# Altium schematic symbol library Schlib.SchLib: 725 symbols (part 2 of 6) (continued)
## DRV8800PWPR
designator U?  (value not drawn)
Bipolar Motor Driver DMOS Parallel 16-HTSSOP; Manufacturer: Texas Instruments; Manufacturer Part Number: DRV8800PWPR; Supplier: Mouser; Supplier Part Number: 595-DRV8800PWPR; RoHS: Yes; Category: Integrated Circuits (ICs); Stock: 2535; Pricing: 1=2.23, 10=1.92, 50=1.92, 100=1.61, 1000=1.1, 10000=0.979 (USD); ComponentLink1URL: https://datasheet.ciiva.com/15109/getdatasheetpartid-482679-15109562.pdf?src-supplier=Verical; ComponentLink1Description: https://datasheet.ciiva.com/15109/getdatasheetpartid-482679-15109562.pdf?src-supplier=Verical; ComponentLink2URL: https://datasheet.ciiva.com/1958/drv8800-1958738.pdf?src-supplier=Digikey; ComponentLink2Description: https://datasheet.ciiva.com/1958/drv8800-1958738.pdf?src-supplier=Digikey; ComponentLink3URL: https://datasheet.ciiva.com/1958/drv8800-1958739.pdf?src-supplier=Digikey; ComponentLink3Description: https://datasheet.ciiva.com/1958/drv8800-1958739.pdf?src-supplier=Digikey; ComponentLink4URL: https://datasheet.ciiva.com/1958/drv8800-1958740.pdf?src-supplier=Digikey; ComponentLink4Description: https://datasheet.ciiva.com/1958/drv8800-1958740.pdf?src-supplier=Digikey; ComponentLink5URL: https://datasheet.ciiva.com/3229/drv8801-3229003.pdf?src-supplier=Avnet; ComponentLink5Description: https://datasheet.ciiva.com/3229/drv8801-3229003.pdf?src-supplier=Avnet
footprint DRV8800PWPR
pins: 1 NFAULT, 2 MODE, 3 PHASE, 4 GND, 5 NSLEEP, 6 ENABLE, 7 OUT+, 8 SENSE, 9 VBB, 10 OUT-, 11 CP1, 12 CP2, 13 GND, 14 VCP, 15 VREG, 16 NC, 17 EPAD

## DS04-254-1L-04BK
designator SW?
Switch DIP OFF ON SPST 4 Raised Slide 0.025A 24VDC PC Pins 2.54mm Thru-Hole Tube; Manufacturer: CUI; Manufacturer Part Number: DS04-254-1L-04BK; Supplier: Digikey; Supplier Part Number: 2223-DS04-254-1L-04BK-ND; RoHS: Yes
footprint DS04-254-1L-04BK
pins: 1A COM1, 1B NO1, 2A COM2, 2B NO2, 3A COM3, 3B NO3, 4A COM4, 4B NO4

## DS04-254-2-01BK-SMT
designator SW?  (value not drawn)
Switch DIP OFF ON SPST 1 Flat Slide 0.025A 24VDC Gull Wing 2.54mm SMD Tube; Manufacturer: CUI Devices; Manufacturer Part Number: DS04-254-2-01BK-SMT; Switching Current: 25mA; Switching Voltage: 24V; Supplier: Digikey; Supplier Part Number: 2223-DS04-254-2-01BK-SMT-ND; RoHS: Yes; Category: DIP Switches; Stock: 6504; Pricing: 1=0.79, 10=0.642, 25=0.5908, 120=0.51167, 360=0.46197, 600=0.4403, 1080=0.41642, 2520=0.38388, 5040=0.35882 (USD); Length: 3.54mm; Width: 6.2mm; Height: 3.66mm; Pitch: 2.54mm; ComponentLink1URL: https://www.cuidevices.com/product/resource/digikeypdf/ds04-254-smt.pdf?src-supplier=Digikey; ComponentLink1Description: https://www.cuidevices.com/product/resource/digikeypdf/ds04-254-smt.pdf?src-supplier=Digikey; ComponentLink2URL: https://datasheet.octopart.com/DS04-254-2-01BK-SMT-CUI-Devices-datasheet-155993650.pdf?src-supplier=Future+Electronics; ComponentLink2Description: https://datasheet.octopart.com/DS04-254-2-01BK-SMT-CUI-Devices-datasheet-155993650.pdf?src-supplier=Future+Electronics
footprint DS04-254-2-01BK-SMT
pins: 1 COM1, 1B NO1

## ECS-80-12-33-JGN-TR
designator Y?  Operating Frequency: 8 mHz  (hidden comment: *)
Crystal 8MHz ±20ppm (Tol) ±30ppm (Stability) 12pF FUND 400Ohm 4-Pin Mini-CSMD T/R; Manufacturer: ECS International; Manufacturer Part Number: ECS-80-12-33-JGN-TR; Supplier: Arrow Electronics; Supplier Part Number: ECS-80-12-33-JGN-TR; RoHS: No; Stock: 22000; Pricing: 1000=0.3051, 3000=0.3048, 5000=0.2963 (USD); RoHS Compliant: Yes; ComponentLink1URL: https://datasheet.octopart.com/ECS-80-12-33-JGN-TR-ECS-International-datasheet-140089731.pdf?src-supplier=Future+Electronics; ComponentLink1Description: https://datasheet.octopart.com/ECS-80-12-33-JGN-TR-ECS-International-datasheet-140089731.pdf?src-supplier=Future+Electronics; ComponentLink2URL: https://datasheet.octopart.com/ECS-80-12-33-JGN-TR-ECS-International-datasheet-17018741.pdf?src-supplier=Master+Electronics; ComponentLink2Description: https://datasheet.octopart.com/ECS-80-12-33-JGN-TR-ECS-International-datasheet-17018741.pdf?src-supplier=Master+Electronics
footprint ECS-80-12-33-JGN-TR
pins: 1, 2, 3, 4

## ECS-160-20-46X
designator Y?
16 MHz Â±30ppm Crystal 20pF 50 Ohms HC-46/X; Manufacturer Part Number: ECS-160-20-46X
footprint XTAL_ECS-160-20-46X
pins: 1, 2

## ECS-250-18-33-JTN-TR
designator Y?  Operating Frequency: 25MHz  (hidden comment: *)
Crystal 25MHz ±20ppm (Tol) ±20ppm (Stability) 18pF FUND 40Ohm 4-Pin Mini-CSMD T/R; Manufacturer: ECS International; Manufacturer Part Number: ECS-250-18-33-JTN-TR; Supplier: Mouser; Supplier Part Number: 520-250-18-33-JTNT; RoHS: Yes; Stock: 1820; Pricing: 1=0.44, 10=0.354, 50=0.354, 100=0.342, 1000=0.305, 10000=0.239 (USD); ComponentLink1URL: http://www.ecsxtal.com/store/pdf/ecx-32.pdf?src-supplier=Digikey; ComponentLink1Description: http://www.ecsxtal.com/store/pdf/ecx-32.pdf?src-supplier=Digikey
footprint ECS-250-18-33-JTN-TR
pins: 1, 2, 3, 4

## ECS-320-8-37CKM
designator Y?
32 MHz Â±10ppm Crystal 8pF 60 Ohms 4-SMD, No Lead; Manufacturer Part Number: ECS-320-8-37CKM
footprint XTAL_ECS-320-8-37CKM
pins: 1 IN/OUT (io), 2 GND (power), 3 OUT/IN (io), 4 GND (power)

## ECS-327MVATX-2-CN-TR
designator Y?  (value not drawn)
Oscillator XO 0.032768MHz ±25ppm 15pF CMOS 55% 1.8V/2.5V/3.3V 4-Pin Mini-SMD T/R; Manufacturer: ECS International; Manufacturer Part Number: ECS-327MVATX-2-CN-TR; Supplier: Digi-Key; Supplier Part Number: XC3154CT-ND; RoHS: Yes; Category: Oscillators; Stock: 12696; Pricing: 1=1.24000, 10=1.09700, 50=1.02560, 100=0.90630, 500=0.85860 (USD)
footprint ECS-327MVATX-2-CN-TR
pins: 1 T_S, 2 GND, 3 OUT, 4 VDD
text: 32.768 kHz

## ECS-327MVATX-3-CN-TR
designator *
Oscillator XO 0.032768MHz ±25ppm 15pF CMOS 55% 1.8V/2.5V/3.3V 4-Pin Mini-SMD T/R; Manufacturer: ECS International; Manufacturer Part Number: ECS-327MVATX-3-CN-TR; Supplier: Future Electronics; Supplier Part Number: 1138685; RoHS: No; Category: Oscillators; Stock: 1000; Pricing: 1000=0.59, 2000=0.575, 3000=0.565, 4000=0.555 (USD); ComponentLink1URL: https://datasheet.octopart.com/ECS-327MVATX-3-CN-TR-ECS-International-datasheet-142139770.pdf?src-supplier=Future+Electronics; ComponentLink1Description: https://datasheet.octopart.com/ECS-327MVATX-3-CN-TR-ECS-International-datasheet-142139770.pdf?src-supplier=Future+Electronics; ComponentLink2URL: https://ecsxtal.com/store/pdf/ECS-327MVATX.pdf?src-supplier=Digi-Key; ComponentLink2Description: https://ecsxtal.com/store/pdf/ECS-327MVATX.pdf?src-supplier=Digi-Key; ComponentLink3URL: https://datasheet.octopart.com/ECS-327MVATX-3-CN-TR-ECS-International-datasheet-164298192.pdf?src-supplier=Master+Electronics; ComponentLink3Description: https://datasheet.octopart.com/ECS-327MVATX-3-CN-TR-ECS-International-datasheet-164298192.pdf?src-supplier=Master+Electronics
footprint ECS-327MVATX-3-CN-TR
pins: 1 T_S, 2 GND, 3 OUT, 4 VDD
text: 32.768 kHz

## ECS-2520MV-240-DN-TR
designator X?  (value not drawn)
Xtal Osc Xo 24.0000MHZ Cmos SMD; Manufacturer: ECS International; Manufacturer Part Number: ECS-2520MV-240-DN-TR; Supplier: Digi-Key; Supplier Part Number: 50-ECS-2520MV-240-DN-TRCT-ND; RoHS: No; Stock: 4023; Pricing: 1=1.23000, 10=1.17400, 50=1.14640, 100=0.98260, 500=0.95532, 1000=0.80520 (USD)
footprint ECS-2520MV-240-DN-TR
pins: 1 Tri-state, 2 GND, 3 OUT, 4 VDD

## EEE-1AA471UAP
designator C?  value 470uF  (hidden comment: *)
Cap Aluminum 470uF 10V 20% (8 X 10.2mm) SMD 390mA 1000 hr 85°C T/R; Manufacturer: Panasonic; Manufacturer Part Number: EEE-1AA471UAP; Life (Hours): 1000Hour; Leakage Current: 3uA; Dissipation Factor: 0.26%; Lead Diameter: 0.9mm; Supplier: Digi-Key; Supplier Part Number: PCE4576CT-ND; RoHS: Yes; Category: Aluminum Electrolytic Capacitors; Stock: 1610; Pricing: 1=0.78, 10=0.55, 50=0.416, 100=0.3623 (USD); Mounting Technology: Surface Mount; Case/Package: Radial; Min Operating Temperature: -40°C; Max Operating Temperature: 85°C; Voltage Rating: 10V; Tolerance: 20%; Ripple Current: 390mA; Packaging: Tape and Reel; Package Quantity: 1; Voltage Rating (DC): 10V; Termination: SMD/SMT; Voltage: 10V; Series: Automotive, AEC-Q200, S; Construction: Cylindrical; Diameter: 8mm; Length: 10.5mm; Height: 10mm; Height - Seated (Max): 0.402inch; Lead Pitch: 3.1mm; Ratings: AEC-Q200; Radiation Hardening: No; RoHS Compliant: Yes; ComponentLink1URL: https://datasheet.ciiva.com/14600/70255709-14600725.pdf?src-supplier=Allied+Electronics; ComponentLink1Description: https://datasheet.ciiva.com/14600/70255709-14600725.pdf?src-supplier=Allied+Electronics; ComponentLink2URL: https://datasheet.ciiva.com/14605/70255709-14605717.pdf?src-supplier=Allied+Electronics; ComponentLink2Description: https://datasheet.ciiva.com/14605/70255709-14605717.pdf?src-supplier=Allied+Electronics; ComponentLink3URL: https://datasheet.ciiva.com/2985/aba0000ce115-2985063.pdf?src-supplier=Avnet; ComponentLink3Description: https://datasheet.ciiva.com/2985/aba0000ce115-2985063.pdf?src-supplier=Avnet; ComponentLink4URL: https://datasheet.ciiva.com/2985/aba0000ce115-2985064.pdf?src-supplier=Avnet; ComponentLink4Description: https://datasheet.ciiva.com/2985/aba0000ce115-2985064.pdf?src-supplier=Avnet; ComponentLink5URL: https://datasheet.ciiva.com/30193/aba0000ce115-30193309.pdf?src-supplier=Onlinecomponents.com; ComponentLink5Description: https://datasheet.ciiva.com/30193/aba0000ce115-30193309.pdf?src-supplier=Onlinecomponents.com
footprint EEE1AA471UAP
pins: 1 P, 2 N

## EEE-FK1H471AM
designator C?  value 470uF  (hidden comment: *)
Capacitor; Aluminum Electrolytic; Ecap 470uF 50V J16 Case Fk SMT; Manufacturer: Panasonic; Manufacturer Part Number: EEE-FK1H471AM; Tolerance: 20%; Ripple Current: 1.61A; Life (Hours): 5000Hour; Dissipation Factor: 0.12%; ESR (Equivalent Series Resistance): 73mR; Supplier: Mouser; Supplier Part Number: 667-EEE-FK1H471AM; RoHS: Yes; Category: Aluminum Electrolytic Capacitors; Stock: 3473; Pricing: 1=2.12, 10=1.5, 50=1.5, 100=1.5, 1000=0.872, 10000=0.777 (USD); Mounting Technology: Surface Mount,PCB; Case/Package: Radial; Min Operating Temperature: -55°C; Max Operating Temperature: 105°C; Construction: Cylindrical; Voltage Rating: 50V; Package Quantity: 125; Packaging: Tape and Reel; Voltage Rating (DC): 50V; Ripple Current (AC): 1.61A; Termination: SMD/SMT; Voltage: 50V; Series: FK; Impedance: 73mR; Diameter: 16mm; Length: 16.5mm; Height: 16.5mm; Ratings: AEC-Q200; Radiation Hardening: No; Reach SVHC Compliant: No; Lead Free: Lead Free; RoHS Compliant: Yes; ComponentLink1URL: https://datasheet.ciiva.com/11783/0900766b80e4e801-11783535.pdf?src-supplier=Rs; ComponentLink1Description: https://datasheet.ciiva.com/11783/0900766b80e4e801-11783535.pdf?src-supplier=Rs; ComponentLink2URL: https://datasheet.ciiva.com/48524/fk-large-eng-tds-48524574.pdf?src-supplier=Distrelec; ComponentLink2Description: https://datasheet.ciiva.com/48524/fk-large-eng-tds-48524574.pdf?src-supplier=Distrelec; ComponentLink3URL: https://datasheet.ciiva.com/31417/1726499-31417534.pdf?src-supplier=Farnell; ComponentLink3Description: https://datasheet.ciiva.com/31417/1726499-31417534.pdf?src-supplier=Farnell; ComponentLink4URL: https://datasheet.ciiva.com/46372/1726499-46372458.pdf?src-supplier=Element14; ComponentLink4Description: https://datasheet.ciiva.com/46372/1726499-46372458.pdf?src-supplier=Element14; ComponentLink5URL: https://datasheet.ciiva.com/14598/70256466-14598694.pdf?src-supplier=Allied+Electronics; ComponentLink5Description: https://datasheet.ciiva.com/14598/70256466-14598694.pdf?src-supplier=Allied+Electronics; ComponentLink6URL: https://datasheet.ciiva.com/14603/70256466-14603807.pdf?src-supplier=Allied+Electronics; ComponentLink6Description: https://datasheet.ciiva.com/14603/70256466-14603807.pdf?src-supplier=Allied+Electronics; ComponentLink7URL: https://datasheet.ciiva.com/48483/aba0000ce88-48483382.pdf?src-supplier=Avnet; ComponentLink7Description: https://datasheet.ciiva.com/48483/aba0000ce88-48483382.pdf?src-supplier=Avnet; ComponentLink8URL: https://datasheet.ciiva.com/16394/aba0000ce88-16394005.pdf?src-supplier=Future+Electronics; ComponentLink8Description: https://datasheet.ciiva.com/16394/aba0000ce88-16394005.pdf?src-supplier=Future+Electronics; ComponentLink9URL: https://datasheet.ciiva.com/11678/aba0000ce88-11678270.pdf?src-supplier=Avnet; ComponentLink9Description: https://datasheet.ciiva.com/11678/aba0000ce88-11678270.pdf?src-supplier=Avnet
footprint EEE-FK1H471AM
pins: 1 P, 2 N

## EEE-FT1H221AL
designator C?  value 220uF  (hidden comment: *)
Cap Aluminum Lytic 220uF 50V 20% (8 X 10.2mm) SMD 0.18 Ohm 670mA 2000h 105C Automotive T/R; Manufacturer: Panasonic; Manufacturer Part Number: EEE-FT1H221AL; Supplier: Mouser; Supplier Part Number: 667-EEE-FT1H221AL; RoHS: No; Category: Capacitors; Stock: 2253; Pricing: 1=1.02, 10=0.643, 50=0.643, 100=0.553, 1000=0.369, 10000=0.309 (USD)
footprint EEEFT1H221AL
pins: 1 P, 2 N

## EEE-FTH101XAP
designator C?  value 100uF  (hidden comment: *)
Aluminum Electrolytic Capacitor, 100 uF, 50 V, ± 20%, 2000 hours @ 105°C, Radial Can - SMD; Manufacturer: Panasonic; Manufacturer Part Number: EEE-FTH101XAP; ESR (Equivalent Series Resistance): 340mR; Ripple Current: 350mA; Voltage Rating: 50V; Leakage Current: 50uA; Dissipation Factor: 10%; Lead Diameter: 0.65mm; Supplier: Mouser; Supplier Part Number: 667-EEE-FTH101XAP; RoHS: Yes; Category: Aluminum Electrolytic Capacitors; Stock: 152358; Pricing: 1=0.81, 10=0.462, 50=0.462, 100=0.412, 1000=0.302, 10000=0.224 (USD); Mounting Technology: Surface Mount,PCB; Case/Package: Radial; Pins: 2; Min Operating Temperature: -55°C; Max Operating Temperature: 105°C; Tolerance: 20%; Ripple Current (AC): 350mA; Packaging: Tape and Reel; Voltage Rating (DC): 50V; Termination: SMD/SMT; Life (Hours): 2000Hour; Voltage: 50V; Package Quantity: 1; Series: FT; Construction: Cylindrical; Diameter: 6.3mm; Length: 7.7mm; Height: 7.7mm; Lead Pitch: 1.8mm; Height - Seated (Max): 0.315inch; Ratings: AEC-Q200; Radiation Hardening: No; Reach SVHC Compliant: No; RoHS Compliant: Yes
footprint EEE-FTH101XAP
pins: 1 P, 2 N

## EEEFK1H102AV
designator C?  value 1mF  (hidden comment: *)
Cap Aluminum 1000uF 50V 20% (16 X 16.5mm) Solder Pin Cylindrical 1610mA 5000 hr 105°C T/R; Manufacturer: Panasonic; Manufacturer Part Number: EEEFK1H102AV; Life (Hours): 5000Hour; Supplier: Mouser; Supplier Part Number: 667-EEE-FK1H102AV; RoHS: Yes; Category: Capacitors; Stock: 40; Pricing: 1=3.1, 10=2.21, 50=2.21, 100=2.21, 1000=1.29, 10000=1.19 (USD); Case/Package: Aluminum; Min Operating Temperature: -55°C; Max Operating Temperature: 105°C; Packaging: Tape and Reel; Termination: SMD/SMT; Voltage Rating (DC): 50V; Tolerance: 20%; Package Quantity: 125; Series: FK; Diameter: 16mm; Length: 16.5mm; Lead Free: Lead Free; RoHS Compliant: Yes; ComponentLink1URL: http://www.mouser.com/ds/2/315/ABA0000C1181-947564.pdf?src-supplier=Mouser; ComponentLink1Description: http://www.mouser.com/ds/2/315/ABA0000C1181-947564.pdf?src-supplier=Mouser
footprint EEEFK1H102AV
pins: 1 P, 2 N

## EMVY101ARA101MKE0S
designator C?  value 100uF  (hidden comment: *)
Cap Aluminum 100uF 100V 20% (12.5 X 13.5mm) SMD 450mA 5000h 105°C T/R; Manufacturer: United Chemi-Con; Manufacturer Part Number: EMVY101ARA101MKE0S; Dielectric Material: 158ConductorMaterial; Polarity: 5066Direction; Dissipation Factor: 10%; Lead/Base Style: 5800ConnectorType; Leakage Current: 100uA; Test Frequency: 100MHz; Supplier: Digikey; Supplier Part Number: 565-2511-1-ND; RoHS: Yes; Category: Aluminum Electrolytic Capacitors; Stock: 3899; Pricing: 1=1.4, 10=1.048, 50=0.9558, 100=0.7831 (USD); Pins: 2NUMBER; Contact Plating: 154ConductorMaterial; Voltage: 100V; Width: 13mm; Radiation Hardening: 5898YesNo; Lead Free: 5697LeadFree; ComponentLink1URL: https://datasheet.ciiva.com/98/mvyseries-98706.pdf?src-supplier=Digikey; ComponentLink1Description: https://datasheet.ciiva.com/98/mvyseries-98706.pdf?src-supplier=Digikey; ComponentLink2URL: https://datasheet.ciiva.com/98/mvyseries-98707.pdf?src-supplier=Digikey; ComponentLink2Description: https://datasheet.ciiva.com/98/mvyseries-98707.pdf?src-supplier=Digikey; ComponentLink3URL: https://datasheet.ciiva.com/98/mvyseries-98708.pdf?src-supplier=Digikey; ComponentLink3Description: https://datasheet.ciiva.com/98/mvyseries-98708.pdf?src-supplier=Digikey; ComponentLink4URL: https://datasheet.ciiva.com/7788/1514044-7788445.pdf?src-supplier=Element14; ComponentLink4Description: https://datasheet.ciiva.com/7788/1514044-7788445.pdf?src-supplier=Element14
footprint EMVY101ARA101MKE0S
pins: 1 P, 2 N

## EP12SD1SAPE
designator SW?  (value not drawn)
EP Series Tiny SPDT On-Momentary Right Angle Through Hole Pushbutton Switch; Manufacturer: ITT C&K; Manufacturer Part Number: EP12SD1SAPE; Supplier: Mouser; Supplier Part Number: 611-EP12SD1SAPE; RoHS: Yes; Category: Pushbutton Switches; Stock: 729; Pricing: 1=7.98, 10=7.18, 50=6.53, 100=6.32, 1000=5.49, 10000=5.23 (USD); ComponentLink1URL: https://datasheet.ciiva.com/46421/1839848-46421054.pdf?src-supplier=Element14; ComponentLink1Description: https://datasheet.ciiva.com/46421/1839848-46421054.pdf?src-supplier=Element14; ComponentLink2URL: https://datasheet.ciiva.com/2869/ep-31aug10-2869716.pdf?src-supplier=Digi-Key; ComponentLink2Description: https://datasheet.ciiva.com/2869/ep-31aug10-2869716.pdf?src-supplier=Digi-Key
footprint EP12SD1SAPE
pins: 1 NC, 2 COMM, 3 NO, MP1, MP2, MP3, MP4

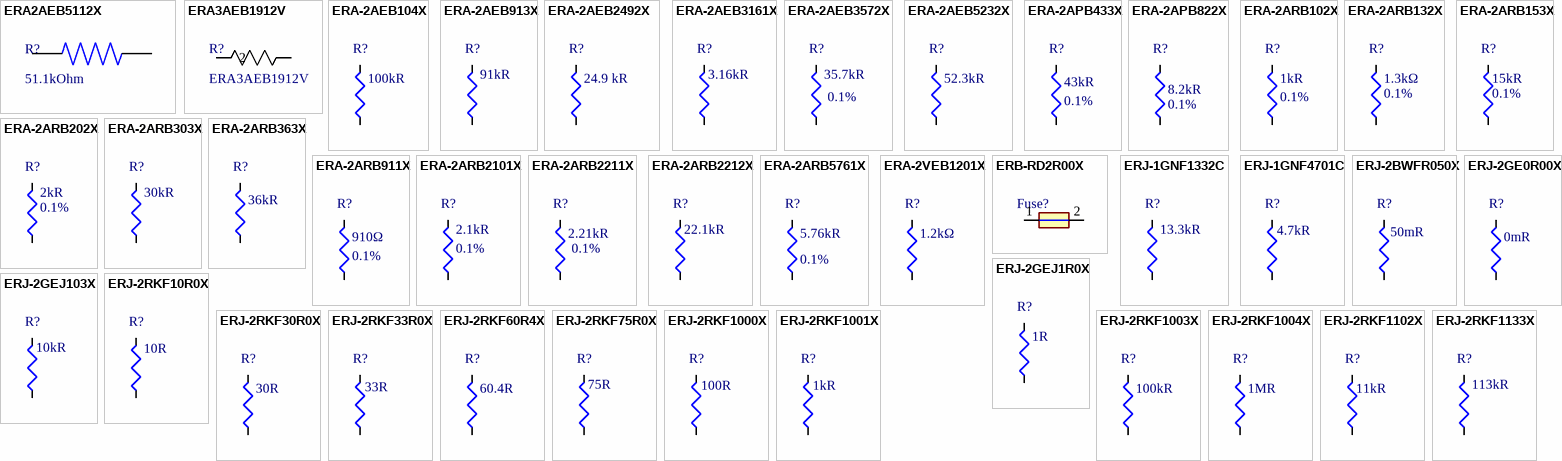
[diagram p8: symbols ERA2AEB5112X to ERJ-2RKF1133X]

## ERA2AEB5112X
designator R?, comment 51.1kOhm
51.1 kOhms ±0.1% 0.063W, 1/16W Chip Resistor 0402 (1005 Metric) Automotive AEC-Q200 Thin Film; Manufacturer Part Number: ERA2AEB5112X
footprint RES_ERA2AEB5112X
pins: 1, 2

## ERA3AEB1912V
designator R?
100mW Thin Film Resistor 75V ±0.1% ±25ppm/℃ 19.1kΩ 0603 Chip Resistor - Surface Mount ROHS; Manufacturer Part Number: ERA3AEB1912V
footprint RES_ERA3A_0603_PAN
pins: 1, 2

## ERA-2AEB104X
designator R?  value 100kR  (hidden comment: *)
Res Thin Film 0402 100K Ohm 0.1% 0.063W ±25ppm/°C Molded SMD Punched Carrier T/R; Manufacturer: Panasonic; Manufacturer Part Number: ERA-2AEB104X; Voltage Rating (DC): 25V; Supplier: Mouser; Supplier Part Number: 667-ERA-2AEB104X; RoHS: Yes; Category: Chip SMD Resistors; Stock: 96467; Pricing: 1=0.17, 10=0.102, 50=0.102, 100=0.091, 1000=0.061, 10000=0.051 (USD); Lead Free: 5697LeadFree; ComponentLink1URL: https://datasheet.ciiva.com/11812/0900766b80beefcc-11812257.pdf?src-supplier=Rs; ComponentLink1Description: https://datasheet.ciiva.com/11812/0900766b80beefcc-11812257.pdf?src-supplier=Rs; ComponentLink2URL: https://datasheet.ciiva.com/16787/70068849-16787783.pdf?src-supplier=Allied+Electronics; ComponentLink2Description: https://datasheet.ciiva.com/16787/70068849-16787783.pdf?src-supplier=Allied+Electronics; ComponentLink3URL: https://datasheet.ciiva.com/46398/328837-46398997.pdf?src-supplier=Element14; ComponentLink3Description: https://datasheet.ciiva.com/46398/328837-46398997.pdf?src-supplier=Element14; ComponentLink4URL: https://datasheet.ciiva.com/16396/aoa0000ce26-16396826.pdf?src-supplier=Future+Electronics; ComponentLink4Description: https://datasheet.ciiva.com/16396/aoa0000ce26-16396826.pdf?src-supplier=Future+Electronics; ComponentLink5URL: https://datasheet.ciiva.com/9186/aoa0000ce26-9186748.pdf?src-supplier=Avnet; ComponentLink5Description: https://datasheet.ciiva.com/9186/aoa0000ce26-9186748.pdf?src-supplier=Avnet; ComponentLink6URL: https://datasheet.ciiva.com/9116/aoa0000ce26-9116650.pdf?src-supplier=Avnet; ComponentLink6Description: https://datasheet.ciiva.com/9116/aoa0000ce26-9116650.pdf?src-supplier=Avnet; ComponentLink7URL: https://datasheet.ciiva.com/5838/328837-5838014.pdf?src-supplier=Farnell; ComponentLink7Description: https://datasheet.ciiva.com/5838/328837-5838014.pdf?src-supplier=Farnell; Case/Package: 0402
footprint R 0402 (1005 Metric) (Chip Capacitor, Body 1.0x0.5mm, IPC High Density)
pins: 1 B, 2 A

## ERA-2AEB913X
designator R?  value 91kR  (hidden comment: *)
Res Thin Film 0402 91K Ohm 0.1% 0.063W ±25ppm/°C Molded SMD Punched Carrier T/R; Manufacturer: Panasonic; Manufacturer Part Number: ERA-2AEB913X; Voltage Rating (DC): 25V; Supplier: Digikey; Supplier Part Number: P91KDCCT-ND; RoHS: Yes; Category: Chip SMD Resistors; Stock: 32482; Pricing: 1=0.17, 10=0.129, 50=0.1014, 100=0.0908, 500=0.06886, 1000=0.06077, 5000=0.04491 (USD); Lead Free: 5697LeadFree; RoHS Compliant: 5897YesNo; ComponentLink1URL: https://datasheet.ciiva.com/46378/1776116-46378238.pdf?src-supplier=Element14; ComponentLink1Description: https://datasheet.ciiva.com/46378/1776116-46378238.pdf?src-supplier=Element14; Case/Package: 0402
footprint R 0402 (1005 Metric) (Chip Capacitor, Body 1.0x0.5mm, IPC High Density)
pins: 1 B, 2 A

## ERA-2AEB2492X
designator R?  value 24.9 kR  (hidden comment: *)
Res Thin Film 0402 24.9K Ohm 0.1% 1/16W ±25ppm/°C Molded SMD SMD Punched Carrier T/R; Manufacturer: Panasonic; Manufacturer Part Number: ERA-2AEB2492X; Voltage Rating (DC): 50V; Supplier: Rs; Supplier Part Number: 1045422; RoHS: Yes; Category: Chip SMD Resistors; Stock: 5200; Pricing: 50=0.106, 250=0.09, 500=0.063, 1000=0.042 (EUR); Lead Free: 5697LeadFree; ComponentLink1URL: http://www.mouser.com/ds/2/315/AOA0000C237-1100991.pdf?src-supplier=Mouser; ComponentLink1Description: http://www.mouser.com/ds/2/315/AOA0000C237-1100991.pdf?src-supplier=Mouser; ComponentLink2URL: http://www.farnell.com/datasheets/2052875.pdf?src-supplier=Farnell; ComponentLink2Description: http://www.farnell.com/datasheets/2052875.pdf?src-supplier=Farnell; ComponentLink3URL: https://datasheet.octopart.com/ERA-2AEB2492X-Panasonic-datasheet-136531316.pdf?src-supplier=Farnell; ComponentLink3Description: https://datasheet.octopart.com/ERA-2AEB2492X-Panasonic-datasheet-136531316.pdf?src-supplier=Farnell; ComponentLink4URL: http://www.farnell.com/datasheets/1818319.pdf?src-supplier=Element14; ComponentLink4Description: http://www.farnell.com/datasheets/1818319.pdf?src-supplier=Element14; ComponentLink5URL: https://industrial.panasonic.com/cdbs/www-data/pdf/RDM0000/AOA0000C307.pdf?src-supplier=Digikey; ComponentLink5Description: https://industrial.panasonic.com/cdbs/www-data/pdf/RDM0000/AOA0000C307.pdf?src-supplier=Digikey; ComponentLink6URL: https://datasheet.octopart.com/ERA-2AEB2492X-Panasonic-datasheet-61114971.pdf?src-supplier=Future+Electronics; ComponentLink6Description: https://datasheet.octopart.com/ERA-2AEB2492X-Panasonic-datasheet-61114971.pdf?src-supplier=Future+Electronics; ComponentLink7URL: https://datasheet.octopart.com/ERA-2AEB2492X-Panasonic-datasheet-154766165.pdf?src-supplier=Master+Electronics; ComponentLink7Description: https://datasheet.octopart.com/ERA-2AEB2492X-Panasonic-datasheet-154766165.pdf?src-supplier=Master+Electronics; Case/Package: 0402
footprint R 0402 (1005 Metric) (Chip Capacitor, Body 1.0x0.5mm, IPC High Density)
pins: 1 B, 2 A

## ERA-2AEB3161X
designator R?  value 3.16kR  (hidden comment: *)
Res Thin Film 0402 3.16K Ohm 0.1% 1/16W ±25ppm/°C Molded SMD Punched Carrier T/R; Manufacturer: Panasonic; Manufacturer Part Number: ERA-2AEB3161X; Supplier: Digikey; Supplier Part Number: P3.16KDCCT-ND; RoHS: Yes; Category: Chip SMD Resistors; Stock: 6985; Pricing: 1=0.17, 10=0.129, 50=0.1014, 100=0.0908, 500=0.06886, 1000=0.06077, 5000=0.04491 (USD); ComponentLink1URL: https://datasheet.ciiva.com/24030/aoa0000ce26-32660-24030152.pdf?src-supplier=Mouser; ComponentLink1Description: https://datasheet.ciiva.com/24030/aoa0000ce26-32660-24030152.pdf?src-supplier=Mouser; ComponentLink2URL: https://datasheet.ciiva.com/48532/aoa0000ce26-48532029.pdf?src-supplier=Avnet; ComponentLink2Description: https://datasheet.ciiva.com/48532/aoa0000ce26-48532029.pdf?src-supplier=Avnet; Case/Package: 0402
footprint R 0402 (1005 Metric) (Chip Capacitor, Body 1.0x0.5mm, IPC High Density)
pins: 1 B, 2 A

## ERA-2AEB3572X
designator R?  value 35.7kR  Tolerance: 0.1%  (hidden comment: *)
Res Thin Film 0402 35.7K Ohm 0.1% 1/16W ±25ppm/°C Molded SMD SMD Punched Carrier T/R; Manufacturer: Panasonic; Manufacturer Part Number: ERA-2AEB3572X; Power Rating: 63mW; Voltage Rating: 25V; Voltage Rating (DC): 50V; Supplier: Mouser; Supplier Part Number: 667-ERA-2AEB3572X; RoHS: Yes; Category: Chip SMD Resistors; Stock: 16858; Pricing: 1=0.17, 10=0.102, 50=0.102, 100=0.091, 1000=0.061, 10000=0.051 (USD); Mounting Technology: Surface Mount; Case/Package: 0402; Case Code (Metric): 1005; Case Code (Imperial): 0402; Contact Plating: Tin; Min Operating Temperature: -55°C; Max Operating Temperature: 155°C; Packaging: Tape and Reel; Package Quantity: 1; Resistor Type: Thin Film; Number of Terminations: 2; Temperature Coefficient: 25ppm/°C; Max Power Dissipation: 63mW; Series: ERA-2A; Resistance Tolerance: 0.1%; Length: 0.039inch; Width: 0.5mm; Height: 0.016inch; Lead Free: Lead Free; RoHS Compliant: Yes; Reach SVHC Compliant: Unknown; ComponentLink1URL: https://datasheet.ciiva.com/9190/aoa0000ce26-9190303.pdf?src-supplier=Avnet; ComponentLink1Description: https://datasheet.ciiva.com/9190/aoa0000ce26-9190303.pdf?src-supplier=Avnet
footprint R 0402 (1005 Metric) (Chip Capacitor, Body 1.0x0.5mm, IPC High Density)
pins: 1 B, 2 A

## ERA-2AEB5232X
designator R?  value 52.3kR  (hidden comment: *)
Res Thin Film 0402 52.3K Ohm 0.1% 0.063W(1/16W) +/-25ppm/C Molded SMD Automotive Punched T/R; Manufacturer: Panasonic; Manufacturer Part Number: ERA-2AEB5232X; Voltage Rating (DC): 50V; Supplier: Mouser; Supplier Part Number: 667-ERA-2AEB5232X; RoHS: Yes; Category: Chip SMD Resistors; Stock: 13277; Pricing: 1=0.17, 10=0.102, 50=0.102, 100=0.091, 1000=0.061, 10000=0.051 (USD); Lead Free: 5697LeadFree; ComponentLink1URL: http://www.mouser.com/ds/2/315/AOA0000C237-1100991.pdf?src-supplier=Mouser; ComponentLink1Description: http://www.mouser.com/ds/2/315/AOA0000C237-1100991.pdf?src-supplier=Mouser; ComponentLink2URL: http://www.farnell.com/datasheets/2052875.pdf?src-supplier=Farnell; ComponentLink2Description: http://www.farnell.com/datasheets/2052875.pdf?src-supplier=Farnell; ComponentLink3URL: https://datasheet.octopart.com/ERA-2AEB5232X-Panasonic-datasheet-136531316.pdf?src-supplier=Farnell; ComponentLink3Description: https://datasheet.octopart.com/ERA-2AEB5232X-Panasonic-datasheet-136531316.pdf?src-supplier=Farnell; ComponentLink4URL: http://www.farnell.com/datasheets/1818319.pdf?src-supplier=Element14; ComponentLink4Description: http://www.farnell.com/datasheets/1818319.pdf?src-supplier=Element14; ComponentLink5URL: https://industrial.panasonic.com/cdbs/www-data/pdf/RDM0000/AOA0000C307.pdf?src-supplier=Digikey; ComponentLink5Description: https://industrial.panasonic.com/cdbs/www-data/pdf/RDM0000/AOA0000C307.pdf?src-supplier=Digikey; ComponentLink6URL: http://www.farnell.com/datasheets/2052875.pdf?src-supplier=Newark; ComponentLink6Description: http://www.farnell.com/datasheets/2052875.pdf?src-supplier=Newark; ComponentLink7URL: https://datasheet.octopart.com/ERA-2AEB5232X-Panasonic-datasheet-33006989.pdf?src-supplier=Newark; ComponentLink7Description: https://datasheet.octopart.com/ERA-2AEB5232X-Panasonic-datasheet-33006989.pdf?src-supplier=Newark; ComponentLink8URL: https://datasheet.octopart.com/ERA-2AEB5232X-Panasonic-datasheet-154766165.pdf?src-supplier=Master+Electronics; ComponentLink8Description: https://datasheet.octopart.com/ERA-2AEB5232X-Panasonic-datasheet-154766165.pdf?src-supplier=Master+Electronics
footprint R 0402 (1005 Metric) (Chip Capacitor, Body 1.0x0.5mm, IPC High Density)
pins: 1 B, 2 A

## ERA-2APB433X
designator R?  value 43kR  Tolerance: 0.1%  (hidden comment: *)
0402 Thin Film Chip Resistor / 0402 SMD Resistor 0.1% 15PPM 43 Kohm; Manufacturer: Panasonic; Manufacturer Part Number: ERA-2APB433X; Max Power Dissipation: 63mW; Temperature Coefficient: 15ppm/°C; Supplier: Mouser; Supplier Part Number: 667-ERA-2APB433X; RoHS: Yes; Category: Chip SMD Resistors; Stock: 8335; Pricing: 1=0.73, 10=0.471, 50=0.471, 100=0.41, 1000=0.24, 10000=0.218 (USD); Case/Package: 0402; Case Code (Metric): 1005; Case Code (Imperial): 0402; Min Operating Temperature: -55°C; Max Operating Temperature: 155°C; Packaging: Cut Tape; Number of Terminations: 2; Features: Automotive AEC-Q200; Series: ERA-2A; Length: 0.039inch; Width: 0.02inch; Height: 0.016inch; Lead Free: Lead Free; ComponentLink1URL: https://media.digikey.com/pdf/Data%20Sheets/Panasonic%20Resistors%20Thermistors%20PDFs/ERA_Series_LE.pdf?src-supplier=Digi-Key; ComponentLink1Description: https://media.digikey.com/pdf/Data%20Sheets/Panasonic%20Resistors%20Thermistors%20PDFs/ERA_Series_LE.pdf?src-supplier=Digi-Key
footprint R 0402 (1005 Metric) (Chip Capacitor, Body 1.0x0.5mm, IPC High Density)
pins: 1 B, 2 A

## ERA-2APB822X
designator R?  value 8.2kR  Tolerance: 0.1%  (hidden comment: *)
0402 Thin Film Chip Resistor / 0402 SMD Resistor 0.1% 15PPM 8.2 Kohm; Manufacturer: Panasonic; Manufacturer Part Number: ERA-2APB822X; Max Power Dissipation: 63mW; Temperature Coefficient: 15ppm/°C; Supplier: Digi-Key; Supplier Part Number: P8.2KCNCT-ND; RoHS: Yes; Category: Chip SMD Resistors; Stock: 10000; Pricing: 1=0.67, 10=0.562, 50=0.4336, 100=0.3774, 500=0.273, 1000=0.22081, 5000=0.20877 (USD); Case/Package: 0402; Case Code (Metric): 1005; Case Code (Imperial): 0402; Min Operating Temperature: -55°C; Max Operating Temperature: 155°C; Packaging: Cut Tape; Number of Terminations: 2; Features: Automotive AEC-Q200; Series: ERA-2A; Ratings: AEC-Q200; Lead Free: Lead Free; ComponentLink1URL: https://media.digikey.com/pdf/Data%20Sheets/Panasonic%20Resistors%20Thermistors%20PDFs/ERA_Series_LE.pdf?src-supplier=Digi-Key; ComponentLink1Description: https://media.digikey.com/pdf/Data%20Sheets/Panasonic%20Resistors%20Thermistors%20PDFs/ERA_Series_LE.pdf?src-supplier=Digi-Key
footprint R 0402 (1005 Metric) (Chip Capacitor, Body 1.0x0.5mm, IPC High Density)
pins: 1 B, 2 A

## ERA-2ARB102X
designator R?  value 1kR  Tolerance: 0.1%  (hidden comment: *)
Res Thin Film 0402 1K Ohm 0.1% 0.063W(1/16W) ±10ppm/C Pad SMD Automotive T/R; Manufacturer: Panasonic; Manufacturer Part Number: ERA-2ARB102X; Voltage Rating: 25V; Power Rating: 63mW; Temperature Coefficient: 10ppm/°C; Supplier: Mouser; Supplier Part Number: 667-ERA-2ARB102X; RoHS: No; Category: Chip SMD Resistors; Stock: 5741; Pricing: 1=0.73, 10=0.517, 50=0.396, 100=0.289, 1000=0.229, 10000=0.22 (USD); Case/Package: 0402; Case Code (Metric): 1005; Case Code (Imperial): 0402; Min Operating Temperature: -55°C; Max Operating Temperature: 155°C; Packaging: Cut Tape; Resistor Type: Thin Film; Number of Terminations: 2; Max Power Dissipation: 63mW; Features: Automotive AEC-Q200; Series: ERA-2A; Resistance Tolerance: 0.1%; Voltage Rating (DC): 25V; Length: 0.039inch; Width: 0.02inch; Height: 0.016inch; Ratings: AEC-Q200; Reach SVHC Compliant: No; Lead Free: 5697LeadFree; ComponentLink1URL: https://datasheet.ciiva.com/46422/1678789-46422459.pdf?src-supplier=Element14; ComponentLink1Description: https://datasheet.ciiva.com/46422/1678789-46422459.pdf?src-supplier=Element14; ComponentLink2URL: https://datasheet.ciiva.com/46422/1678789-46422460.pdf?src-supplier=Element14; ComponentLink2Description: https://datasheet.ciiva.com/46422/1678789-46422460.pdf?src-supplier=Element14
footprint R 0402 (1005 Metric) (Chip Capacitor, Body 1.0x0.5mm, IPC High Density)
pins: 1 B, 2 A

## ERA-2ARB132X
designator R?  value 1.3kΩ  Tolerance: 0.1%  (hidden comment: *)
Res Thin Film 0402 1.3K Ohm 0.1% 0.063W(1/16W) ±10ppm/C Pad SMD Automotive T/R; Manufacturer: Panasonic; Manufacturer Part Number: ERA-2ARB132X; Manufacturer Lifecycle Status: ACTIVE; Part Series: Thin Film Chip Resistors, High Reliability Type; Max Power Dissipation: 63mW; Temperature Coefficient: 10ppm/°C; Voltage Rating: 50V; Supplier: DigiKey; Supplier Part Number: P1.3KCPCT-ND; RoHS: Compliant; Category: Chip SMD Resistors; Stock: 5776; Pricing: 1=0.46, 10=0.386, 25=0.358, 50=0.3382, 100=0.3198, 250=0.29784, 500=0.28296, 1000=0.26954, 5000=0.26889 (USD); Case/Package: 0402; Case Code (Imperial): 0402; Case Code (Metric): 1005; Composition: Thin Film; Features: Automotive AEC-Q200; Height: 350µm; Lead Free: Lead Free; Length: 990.6µm; Lifecycle Status: Production; Max Operating Temperature: 155°C; Min Operating Temperature: -55°C; Mounting Technology: Surface Mount; Number of Terminals: 2; Number of Terminations: 2; Packaging: Cut Tape; Power Dissipation: 63mW; Power Rating: 63mW; REACH SVHC: Yes; Voltage Rating (DC): 50V; Width: 500µm; Working Voltage: 50V; ComponentLink1URL: https://datasheet.octopart.com:443/ERA-2ARB132X-Panasonic-datasheet-62287448.pdf?src-supplier=Panasonic; ComponentLink1Description: https://datasheet.octopart.com:443/ERA-2ARB132X-Panasonic-datasheet-62287448.pdf?src-supplier=Panasonic; ComponentLink2URL: https://datasheet.octopart.com:443/ERA-2ARB132X-Panasonic-datasheet-46744048.pdf?src-supplier=Newark; ComponentLink2Description: https://datasheet.octopart.com:443/ERA-2ARB132X-Panasonic-datasheet-46744048.pdf?src-supplier=Newark; ComponentLink3URL: https://datasheet.octopart.com:443/ERA-2ARB132X-Panasonic-datasheet-136531316.pdf?src-supplier=element14+APAC; ComponentLink3Description: https://datasheet.octopart.com:443/ERA-2ARB132X-Panasonic-datasheet-136531316.pdf?src-supplier=element14+APAC; ComponentLink4URL: https://sigma.octopart.com:443/150570796/technical_drawing/Panasonic-ERA2ARB132X.pdf?src-supplier=Panasonic+SCT; ComponentLink4Description: https://sigma.octopart.com:443/150570796/technical_drawing/Panasonic-ERA2ARB132X.pdf?src-supplier=Panasonic+SCT; ComponentLink5URL: https://datasheet.octopart.com/ERA-2ARB132X-Panasonic-datasheet-78375410.pdf; ComponentLink5Description: https://datasheet.octopart.com/ERA-2ARB132X-Panasonic-datasheet-78375410.pdf
footprint R 0402 (1005 Metric) (Chip Capacitor, Body 1.0x0.5mm, IPC High Density)
pins: 1 B, 2 A

## ERA-2ARB153X
designator R?  value 15kR  Tolerance: 0.1%  (hidden comment: *)
Resistor 0402 Thin film chip resistor 0402 SMD Resistor 0.1% 10ppm 15Kohm; Manufacturer: Panasonic; Manufacturer Part Number: ERA-2ARB153X; Voltage Rating: 25V; Power Rating: 63mW; Temperature Coefficient: 10ppm/°C; Supplier: Mouser; Supplier Part Number: 667-ERA-2ARB153X; RoHS: Yes; Category: Chip SMD Resistors; Stock: 14660; Pricing: 1=0.73, 10=0.518, 50=0.396, 100=0.351, 1000=0.229, 10000=0.228 (USD); Mounting Technology: Surface Mount; Case/Package: 0402; Case Code (Metric): 1005; Case Code (Imperial): 0402; Min Operating Temperature: -55°C; Max Operating Temperature: 155°C; Packaging: Cut Tape; Resistor Type: Thin Film; Number of Terminations: 2; Max Power Dissipation: 63mW; Voltage Rating (DC): 25V; Features: Automotive AEC-Q200; Series: ERA-2A; Resistance Tolerance: 0.1%; Length: 0.039inch; Width: 0.02inch; Height: 0.016inch; Reach SVHC Compliant: No; Lead Free: Lead Free; ComponentLink1URL: https://datasheet.ciiva.com/46422/1678789-46422469.pdf?src-supplier=Element14; ComponentLink1Description: https://datasheet.ciiva.com/46422/1678789-46422469.pdf?src-supplier=Element14; ComponentLink2URL: https://datasheet.ciiva.com/46422/1678789-46422470.pdf?src-supplier=Element14; ComponentLink2Description: https://datasheet.ciiva.com/46422/1678789-46422470.pdf?src-supplier=Element14
footprint R 0402 (1005 Metric) (Chip Capacitor, Body 1.0x0.5mm, IPC High Density)
pins: 1 B, 2 A

## ERA-2ARB202X
designator R?  value 2kR  Tolerance: 0.1%  (hidden comment: *)
Res Thin Film 0402 2K Ohm 0.1% 0.063W(1/16W) ±10ppm/C Pad SMD Automotive T/R; Manufacturer: Panasonic; Manufacturer Part Number: ERA-2ARB202X; Power Rating: 63mW; Voltage Rating: 50V; Temperature Coefficient: 10ppm/°C; Supplier: Future Electronics; Supplier Part Number: 4180880; RoHS: Yes; Category: Chip SMD Resistors; Stock: 20000; Pricing: 10000=0.21 (USD); Case/Package: 0402; Case Code (Metric): 1005; Case Code (Imperial): 0402; Min Operating Temperature: -55°C; Max Operating Temperature: 155°C; Packaging: Cut Tape; Resistor Type: Thin Film; Number of Terminations: 2; Max Power Dissipation: 63mW; Features: Automotive AEC-Q200; Series: ERA-2A; Resistance Tolerance: 0.1%; Voltage Rating (DC): 50V; Length: 0.039inch; Width: 0.02inch; Height: 0.016inch; Reach SVHC Compliant: No; RoHS Compliant: Yes; Lead Free: 5697LeadFree; ComponentLink1URL: https://media.digikey.com/pdf/Data%20Sheets/Panasonic%20Resistors%20Thermistors%20PDFs/ERA_Series_LE.pdf?src-supplier=Digikey; ComponentLink1Description: https://media.digikey.com/pdf/Data%20Sheets/Panasonic%20Resistors%20Thermistors%20PDFs/ERA_Series_LE.pdf?src-supplier=Digikey; ComponentLink2URL: https://datasheet.octopart.com/ERA2ARB202X-Panasonic-datasheet-136531316.pdf?src-supplier=Farnell; ComponentLink2Description: https://datasheet.octopart.com/ERA2ARB202X-Panasonic-datasheet-136531316.pdf?src-supplier=Farnell; ComponentLink3URL: http://www.farnell.com/datasheets/1937238.pdf?src-supplier=Element14; ComponentLink3Description: http://www.farnell.com/datasheets/1937238.pdf?src-supplier=Element14; ComponentLink4URL: https://datasheet.octopart.com/ERA-2ARB202X-Panasonic-datasheet-46744048.pdf?src-supplier=Newark; ComponentLink4Description: https://datasheet.octopart.com/ERA-2ARB202X-Panasonic-datasheet-46744048.pdf?src-supplier=Newark; ComponentLink5URL: https://industrial.panasonic.com/cdbs/www-data/pdf/RDM0000/AOA0000C307.pdf?src-supplier=Digikey; ComponentLink5Description: https://industrial.panasonic.com/cdbs/www-data/pdf/RDM0000/AOA0000C307.pdf?src-supplier=Digikey
footprint R 0402 (1005 Metric) (Chip Capacitor, Body 1.0x0.5mm, IPC High Density)
pins: 1 B, 2 A

## ERA-2ARB303X
designator R?  value 30kR  (hidden comment: *)
0402 Thin Film Chip Resistor / 0402 SMD Resistor 0.1% 10PPM 30 Kohm; Manufacturer: Panasonic; Manufacturer Part Number: ERA-2ARB303X; Power Rating: 63mW; Voltage Rating: 50V; Temperature Coefficient: 10ppm/°C; Supplier: Mouser; Supplier Part Number: 667-ERA-2ARB303X; RoHS: Yes; Category: Chip SMD Resistors; Stock: 31600; Pricing: 1=0.71, 10=0.46, 50=0.46, 100=0.4, 1000=0.234, 10000=0.221 (USD); Case/Package: 0402; Case Code (Metric): 1005; Case Code (Imperial): 0402; Min Operating Temperature: -55°C; Max Operating Temperature: 155°C; Packaging: Cut Tape; Resistor Type: Thin Film; Number of Terminations: 2; Tolerance: 0.1%; Max Power Dissipation: 63mW; Features: Automotive AEC-Q200; Series: ERA-2A; Resistance Tolerance: 0.1%; Length: 0.039inch; Width: 0.02inch; Height: 0.016inch; Reach SVHC Compliant: No; RoHS Compliant: Yes; ComponentLink1URL: https://media.digikey.com/pdf/Data%20Sheets/Panasonic%20Resistors%20Thermistors%20PDFs/ERA_Series_LE.pdf?src-supplier=Digi-Key; ComponentLink1Description: https://media.digikey.com/pdf/Data%20Sheets/Panasonic%20Resistors%20Thermistors%20PDFs/ERA_Series_LE.pdf?src-supplier=Digi-Key; ComponentLink2URL: http://www.farnell.com/datasheets/1937238.pdf?src-supplier=Farnell; ComponentLink2Description: http://www.farnell.com/datasheets/1937238.pdf?src-supplier=Farnell; ComponentLink3URL: http://www.farnell.com/datasheets/2052875.pdf?src-supplier=Farnell; ComponentLink3Description: http://www.farnell.com/datasheets/2052875.pdf?src-supplier=Farnell; ComponentLink4URL: http://www.farnell.com/datasheets/1937238.pdf?src-supplier=Element14; ComponentLink4Description: http://www.farnell.com/datasheets/1937238.pdf?src-supplier=Element14; ComponentLink5URL: https://industrial.panasonic.com/cdbs/www-data/pdf/RDM0000/AOA0000C307.pdf?src-supplier=Digi-Key; ComponentLink5Description: https://industrial.panasonic.com/cdbs/www-data/pdf/RDM0000/AOA0000C307.pdf?src-supplier=Digi-Key
footprint R 0402 (1005 Metric) (Chip Capacitor, Body 1.0x0.5mm, IPC High Density)
pins: 1 B, 2 A

## ERA-2ARB363X
designator R?  value 36kR  (hidden comment: *)
Res Thin Film 0402 36K Ohm 0.1% 0.063W(1/16W) ±10ppm/C Pad SMD Automotive T/R; Manufacturer: Panasonic; Manufacturer Part Number: ERA-2ARB363X; Voltage Rating (DC): 50V; Supplier: Mouser; Supplier Part Number: 667-ERA-2ARB363X; RoHS: Yes; Category: Chip SMD Resistors; Stock: 6746; Pricing: 1=0.71, 10=0.46, 50=0.46, 100=0.4, 1000=0.234, 10000=0.221 (USD); Lead Free: 5697LeadFree; ComponentLink1URL: https://datasheet.octopart.com/ERA-2ARB363X-Panasonic-datasheet-136531316.pdf?src-supplier=Farnell; ComponentLink1Description: https://datasheet.octopart.com/ERA-2ARB363X-Panasonic-datasheet-136531316.pdf?src-supplier=Farnell; ComponentLink2URL: http://www.farnell.com/datasheets/1937238.pdf?src-supplier=Element14; ComponentLink2Description: http://www.farnell.com/datasheets/1937238.pdf?src-supplier=Element14; ComponentLink3URL: https://industrial.panasonic.com/cdbs/www-data/pdf/RDM0000/AOA0000C307.pdf?src-supplier=Digi-Key; ComponentLink3Description: https://industrial.panasonic.com/cdbs/www-data/pdf/RDM0000/AOA0000C307.pdf?src-supplier=Digi-Key; ComponentLink4URL: https://datasheet.octopart.com/ERA-2ARB363X-Panasonic-datasheet-46744048.pdf?src-supplier=Newark; ComponentLink4Description: https://datasheet.octopart.com/ERA-2ARB363X-Panasonic-datasheet-46744048.pdf?src-supplier=Newark; Case/Package: 0402
footprint R 0402 (1005 Metric) (Chip Capacitor, Body 1.0x0.5mm, IPC High Density)
pins: 1 B, 2 A
